# Altium footprint library LongMen.PcbLib: 245 footprints (part 1 of 16)
Each footprint in its own frame and in the unit in brackets; x right, y up, seen from the top. Pads: shape width x height; smd on the part's side, far side on the other; paste and mask are expansions set on the pad; w line width, h text height; cw(c..) or ccw(c..) is an arc to the next point about the centre after c.
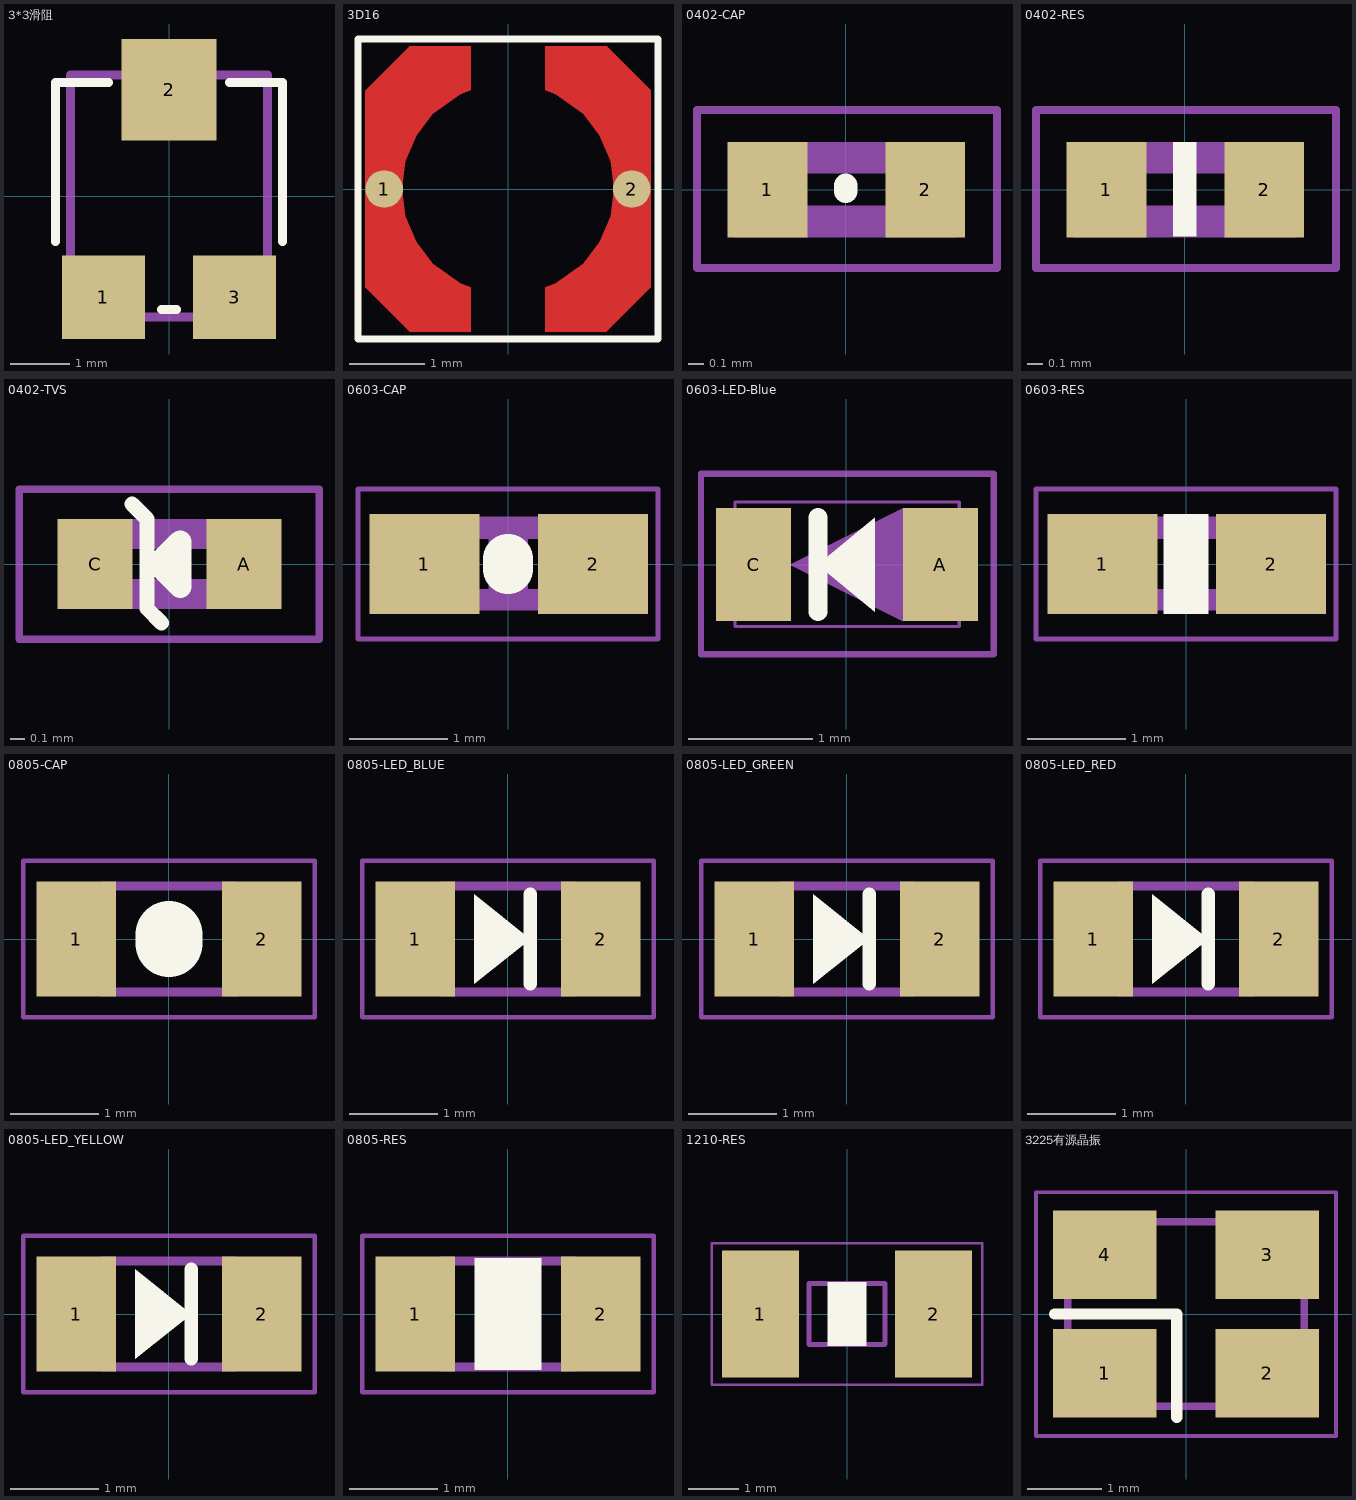
[diagram p0: the footprints below, top view; thin cyan lines are the x and y axes]

## 3*3滑阻 [mm]
height 2
pads (3):
  rect 1.4x1.4 smd: 1(-1.1,-1.7) 3(1.1,-1.7)
  rect 1.6x1.7 smd: 2(0,1.786)
Top Overlay:
  lines w0.152: -1.905,-0.762 -1.905,1.905 -1.016,1.905 ; -0.127,-1.905 0.127,-1.905 ; 1.016,1.905 1.905,1.905 1.905,-0.762
Mechanical 16:
  lines w0.152: -1.651,-2.032 -1.651,2.032 1.651,2.032 1.651,-2.032 -1.651,-2.032
3D body: height 1.67, standoff 0, extent -1.553,-1.911 1.553,1.971

## 3D16 [mm]
height 1.8
pads (2):
  round 0.5 smd: 1(-1.651,0) 2(1.651,0)
Top Layer:
  region: -1.905,-1.309 -1.905,1.309 -1.309,1.905 -0.5,1.905 -0.5,1.316 -0.639,1.263 -1.001,1.006 -1.226,0.712 -1.368,0.371 -1.416,0.004 -1.368,-0.362 -1.226,-0.704 -1.001,-0.997 -0.637,-1.256 -0.497,-1.309 -0.5,-1.905 -1.309,-1.905
  region: 1.905,-1.309 1.905,1.316 1.316,1.905 0.5,1.905 0.5,1.316 0.639,1.263 1.001,1.006 1.226,0.712 1.368,0.371 1.416,0.004 1.368,-0.362 1.226,-0.704 1.001,-0.997 0.637,-1.256 0.497,-1.309 0.5,-1.905 1.309,-1.905
Top Overlay:
  lines w0.1: -2,-2 -2,2 2,2 2,-2 -2,-2
3D body: height 1.8, standoff -0.01, extent -2,-2 2,2

## 0402-CAP [mil]
pads (2):
  rect 20x24 smd: 1(-19.68,0) 2(20,0)
Top Overlay:
  lines w6: 0,-0.39 0,1
Mechanical 16:
  rectangle: -28,-12 -16,12
  rectangle: 16,-12 28,12
  lines w2: -37.4,-19.68 -37.4,20 38,20 38,-19.68 -37.4,-19.68
  lines w8: -20,-8 20,-8 ; -20,8 20,8
3D body: height 19.68, standoff 0, extent -19.68,-9.84 19.68,9.84

## 0402-RES [mil] "0402-RES"
pads (2):
  rect 20x24 smd: 1(-19.68,0) 2(20,0)
Top Overlay:
  rectangle: -3,-11.81 3,12
Mechanical 16:
  rectangle: -28,-12 -16,12
  rectangle: 16,-12 28,12
  lines w2: -37.4,-19.68 -37.4,20 38,20 38,-19.68 -37.4,-19.68
  lines w8: -20,-8 20,-8 ; -20,8 20,8
3D body: height 19.68, standoff 0, extent -19.68,-9.84 19.68,9.84

## 0402-TVS [mil] "0402-TVS"
pads (2):
  rect 20x24 smd: A(20,0) C(-19.68,0)
Top Overlay:
  lines w4: -9.84,16 -5.91,12 -5.91,-11.81 -1.97,-15.75
  lines w6: -3,0 3,0 ; -3,0 3,-6 3,0 ; -3,0 3,6 3,0
Mechanical 16:
  rectangle: 16,-12 28,12
  rectangle: -28,-12 -16,12
  lines w2: -40,-20 40,-20 40,20 -40,20 -40,-20
  lines w8: -20,-8 20,-8 ; -20,8 20,8
3D body: height 19.68, standoff 0, extent -19.69,-9.84 19.68,9.84

## 0603-CAP [mil] "0603-CAP"
pads (2):
  rect 44x40 smd: 1(-33.46,0) 2(34,0)
Top Overlay:
  lines w20: 0,-2 0,2
Mechanical 6:
  rectangle: -7.87,-11.81 8,12
Mechanical 16:
  rectangle: 20,-18.5 40,19
  rectangle: -40,-18.5 -20,19
  rectangle: -20,10 20,19
  rectangle: -20,-18.5 20,-10
  lines w2: -60,-30 -60,30 60,30 60,-30 -60,-30
3D body: height 34.25, standoff -0.39, extent -31.5,-15.94 31.5,15.95

## 0603-LED-Blue [mil] "0603-LED_Blue"
pads (2):
  rect 24x36 smd: A(30,0) C(-29.53,0)
Top Overlay:
  region: -9,0 9,15 9,-15
  lines w6: -9,-15 -9,15
Mechanical 16:
  region: -18,0 18,18 18,-18
  lines w1: -35.43,-19.68 -35.43,20 36,20 36,-19.68 -35.43,-19.68
  lines w2: -46.26,-28.54 47,-28.54 47,29 -46.26,29 -46.26,-28.54
3D body: height 35.43, standoff 0, extent -33.46,-17.72 33.47,17.72

## 0603-RES [mil] "0603-RES"
pads (2):
  rect 44x40 smd: 1(-33.46,0) 2(34,0)
Top Overlay:
  rectangle: -9,-20 9,20
Mechanical 6:
  rectangle: -7.87,-11.81 8,12
Mechanical 16:
  rectangle: -20,-18.5 20,-10
  rectangle: -20,10 20,19
  rectangle: -40,-18.5 -20,19
  rectangle: 20,-18.5 40,19
  lines w2: -60,-30 60,-30 60,30 -60,30 -60,-30
3D body: height 34.25, standoff -0.39, extent -31.5,-15.94 31.5,15.95

## 0805-CAP [mm]
pads (2):
  rect 0.9x1.3 smd: 1(-1.05,0) 2(1.05,0)
Top Overlay:
  lines w0.762: 0,-0.051 0,0.051
Mechanical 16:
  lines w0.051: -1.651,-0.889 -1.651,0.889 1.651,0.889 1.651,-0.889 -1.651,-0.889
  lines w0.1: -0.762,-0.6 -0.75,-0.588 -0.75,0.6 0.75,0.6 0.75,-0.588 0.762,-0.6 -0.762,-0.6
3D body: height 0.78, standoff 0, extent -1,-0.625 1,0.625

## 0805-LED_BLUE [mm]
pads (2):
  rect 0.9x1.3 smd: 1(-1.05,0) 2(1.05,0)
Top Overlay:
  region: -0.381,0.508 -0.381,-0.508 0.254,0
  lines w0.152: 0.254,-0.508 0.254,0.508
Mechanical 16:
  lines w0.051: -1.651,-0.889 1.651,-0.889 1.651,0.889 -1.651,0.889 -1.651,-0.889
  lines w0.1: -0.75,-0.6 -0.75,0.6 0.75,0.6 0.75,-0.6 -0.75,-0.6
3D body: height 1.1, standoff 0, extent -1.01,-0.625 1.01,0.625

## 0805-LED_GREEN [mm]
pads (2):
  rect 0.9x1.3 smd: 1(-1.05,0) 2(1.05,0)
Top Overlay:
  region: -0.381,0.508 -0.381,-0.508 0.254,0
  lines w0.152: 0.254,-0.508 0.254,0.508
Mechanical 16:
  lines w0.051: -1.651,-0.889 1.651,-0.889 1.651,0.889 -1.651,0.889 -1.651,-0.889
  lines w0.1: -0.75,-0.6 -0.75,0.6 0.75,0.6 0.75,-0.6 -0.75,-0.6
3D body: height 1.1, standoff 0, extent -1.01,-0.625 1.01,0.625

## 0805-LED_RED [mm]
pads (2):
  rect 0.9x1.3 smd: 1(-1.05,0) 2(1.05,0)
Top Overlay:
  region: -0.381,0.508 -0.381,-0.508 0.254,0
  lines w0.152: 0.254,-0.508 0.254,0.508
Mechanical 16:
  lines w0.051: -1.651,-0.889 -1.651,0.889 1.651,0.889 1.651,-0.889 -1.651,-0.889
  lines w0.1: -0.75,-0.6 -0.75,0.6 0.75,0.6 0.75,-0.6 -0.75,-0.6
3D body: height 1.1, standoff 0, extent -1.01,-0.625 1.01,0.625

## 0805-LED_YELLOW [mm]
pads (2):
  rect 0.9x1.3 smd: 1(-1.05,0) 2(1.05,0)
Top Overlay:
  region: -0.381,0.508 -0.381,-0.508 0.254,0
  lines w0.152: 0.254,-0.508 0.254,0.508
Mechanical 16:
  lines w0.051: -1.651,-0.889 1.651,-0.889 1.651,0.889 -1.651,0.889 -1.651,-0.889
  lines w0.1: -0.75,-0.6 0.75,-0.6 0.75,0.6 -0.75,0.6 -0.75,-0.6
3D body: height 1.1, standoff 0, extent -1.01,-0.625 1.01,0.625

## 0805-RES [mm]
pads (2):
  rect 0.9x1.3 smd: 1(-1.05,0) 2(1.05,0)
Top Overlay:
  rectangle: -0.381,-0.635 0.381,0.635
Mechanical 16:
  lines w0.051: -1.651,-0.889 1.651,-0.889 1.651,0.889 -1.651,0.889 -1.651,-0.889
  lines w0.1: -0.762,-0.6 0.762,-0.6 0.75,-0.588 0.75,0.6 -0.75,0.6 -0.75,-0.588 -0.762,-0.6
3D body: height 0.78, standoff 0, extent -1,-0.625 1,0.625

## 1210-RES [mm]
pads (2):
  rect 1.52x2.5 smd: 1(-1.71,0) 2(1.71,0)
Top Overlay:
  rectangle: -0.381,-0.635 0.381,0.635
Mechanical 16:
  lines w0.051: -2.667,-1.397 2.667,-1.397 2.667,1.397 -2.667,1.397 -2.667,-1.397
  lines w0.1: -0.75,-0.6 -0.75,-0.588 -0.75,0.6 0.75,0.6 0.75,-0.588 0.738,-0.6 -0.75,-0.6

## 3225有源晶振 [mm] "有源晶振 4脚"
height 0.7
pads (4):
  rect 1.4x1.2 smd: 1(-1.1,-0.8) 2(1.1,-0.8) 3(1.1,0.8) 4(-1.1,0.8)
Top Overlay:
  lines w0.152: -1.778,0 -0.127,0 -0.127,-1.397
Mechanical 16:
  lines w0.051: -2.032,-1.651 -2.032,1.651 2.032,1.651 2.032,-1.651 -2.032,-1.651
  lines w0.1: -1.6,-1.25 -1.6,1.25 1.6,1.25 1.6,-1.25 -1.6,-1.25
3D body: height 0.6, standoff 0, extent -1.6,-1.27 1.6,1.23